# Altium footprint library Library.PcbLib: 298 footprints (part 13 of 19)
Each footprint in its own frame and in the unit in brackets; x right, y up, seen from the top. Pads: shape width x height; smd on the part's side, far side on the other; paste and mask are expansions set on the pad; w line width, h text height; cw(c..) or ccw(c..) is an arc to the next point about the centre after c.
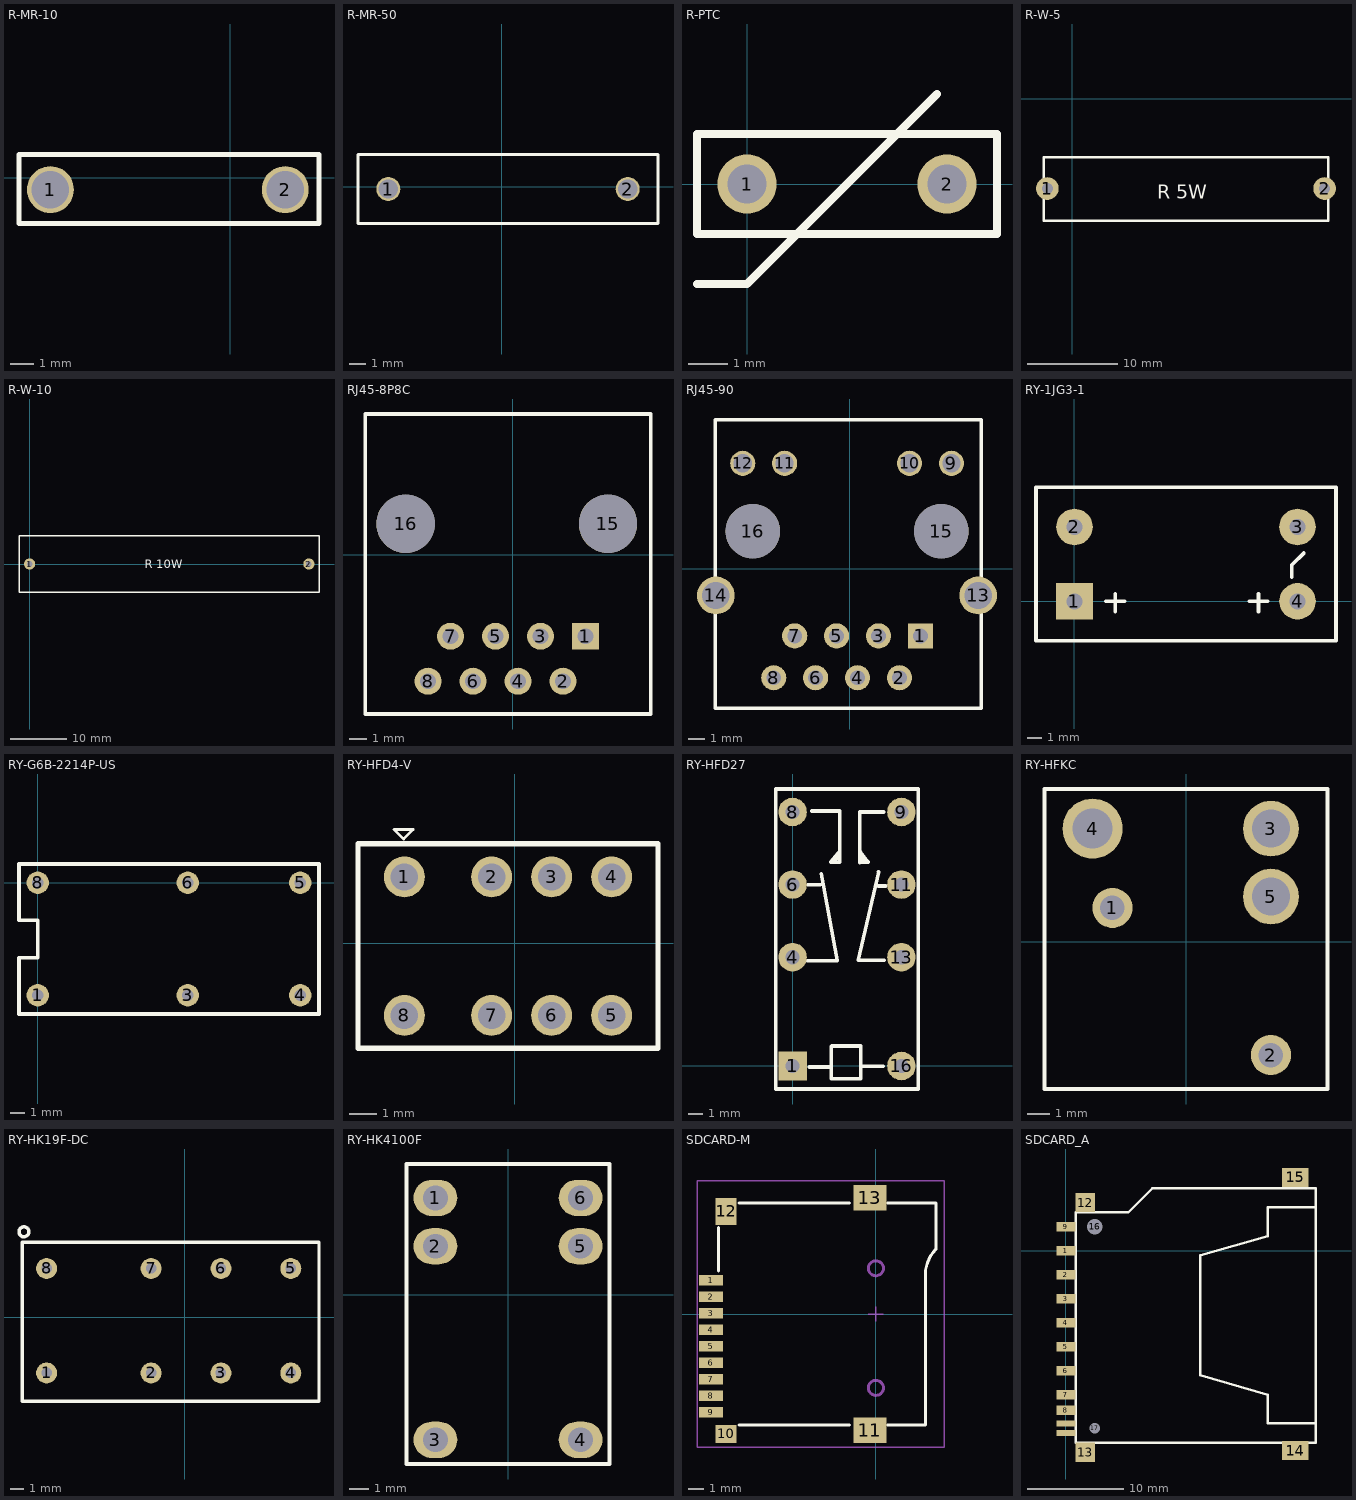
[diagram p12: the footprints below, top view; thin cyan lines are the x and y axes]

## R-MR-10 [mm] "康铜丝"
pads (2):
  round 2 hole 1.6: 1(-7.652,-0.508) 2(2.348,-0.508)
Top Overlay:
  lines w0.203: -8.992,-1.956 -8.992,0.991 3.785,0.991 3.785,-1.956 -8.992,-1.956

## R-MR-50 [mm] "康铜丝"
pads (2):
  round 1.5 hole 1.2: 1(-7.119,-0.127) 2(7.881,-0.127)
Top Overlay:
  lines w0.203: -9.017,-2.286 9.779,-2.286 9.779,2.032 -9.017,2.032 -9.017,-2.286

## R-PTC [mm]
pads (2):
  round 1.5 hole 1 unplated: 1(0,0) 2(5.08,0)
Top Overlay:
  lines w0.203: -1.27,-2.54 0,-2.54 4.826,2.286 ; -1.27,-1.27 -1.27,1.27 6.35,1.27 6.35,-1.27 -1.27,-1.27

## R-W-5 [mm] "功率电阻"
pads (2):
  round 2.5 hole 1.2: 1(-2.746,-9.911) 2(27.835,-9.911)
Top Overlay:
  lines w0.254: -3.153,-13.467 28.242,-13.467 28.242,-6.457 -3.153,-6.457 -3.153,-13.467
  text "R 5W" at 9.373,-11.049 h1.52
3D body "水泥电阻 5": height 4.35, standoff -6.85, extent -3.095,-13.431 28.185,-6.431

## R-W-10 [mm] "功率电阻"
pads (2):
  round 2 hole 1: 1(0,0) 2(50,0)
Top Overlay:
  lines w0.254: -1.905,-5.08 -1.905,5.08 50.8,5.08 51.816,5.08 51.816,-5.08 -1.905,-5.08
  text "R 10W" at 20.574,-0.762 h1.52

## RJ45-8P8C [mil]
pads (10):
  rect 60x60 hole 35.43: 1(162,-181)
  round 60 hole 35.43: 2(112,-281) 3(62,-181) 4(12,-281) 5(-38,-181) 6(-88,-281) 7(-138,-181) 8(-188,-281)
  round 129.92 hole 129.92: 15(212,69) 16(-238,69)
Top Overlay:
  lines w7.87: -327.96,-353.83 -327.96,313.09 307.41,313.09 307.41,-353.83 -327.96,-353.83
3D body "RJ45-8P-Pipe-Cat6.step": height 572.83, standoff -141.73, extent -359,-468.44 333.91,476.44

## RJ45-90 [mil]
pads (16):
  rect 60x60 hole 35.43: 1(169.2,-160)
  round 60 hole 35.43: 2(119.2,-260) 3(69.2,-160) 4(19.2,-260) 5(-30.8,-160) 6(-80.8,-260) 7(-130.8,-160) 8(-180.8,-260)
  round 60 hole 43.31: 9(243.21,251.81) 10(143.21,251.81) 11(-154.82,251.81) 12(-254.82,251.81)
  round 90 hole 64.96: 13(306.99,-63.54) 14(-318.99,-63.54)
  round 129.92 hole 129.92: 15(219.2,90) 16(-230.8,90)
Top Overlay:
  lines w7.87: -320.76,-332.83 -320.76,355.75 314.61,355.75 314.61,-332.83 -320.76,-332.83
3D body "User Library-RMS-001L-08A0-GY.STEP": height 90.55, standoff -570.87, extent -317.92,-329.29 312,509.29

## RY-1JG3-1 [mm]
pads (4):
  rect 2.5x2.5 hole 1.1: 1(0,0)
  round 2.5 hole 1.1: 2(0,5.08) 3(15.24,5.08) 4(15.24,0)
Top Overlay:
  lines w0.254: 2.159,0 3.429,0 ; 2.794,-0.709 2.794,0.508 ; 11.938,0 13.208,0 ; 12.573,-0.709 12.573,0.508 ; 14.85,1.65 14.85,2.475 15.675,3.3 ; -2.63,-2.7 -2.63,7.8 17.87,7.8 17.87,-2.7 -2.63,-2.7

## RY-G6B-2214P-US [mil]
pads (6):
  round 60 hole 30: 1(0,-300) 3(400,-300) 4(700,-300) 5(700,0) 6(400,0) 8(0,0)
Top Overlay:
  lines w10: -50,-350 -50,-200 0,-200 0,-100 -50,-100 -50,50 750,50 750,-350 -50,-350

## RY-HFD4-V [mm]
pads (8):
  round 1.5 hole 1: 1(-4.051,2.425) 2(-0.851,2.425) 3(1.349,2.425) 4(3.549,2.425) 5(3.549,-2.655) 6(1.349,-2.655) 7(-0.851,-2.655) 8(-4.051,-2.655)
Top Overlay:
  lines w0.1: -3.733,4.162 -4.43,4.162 -4.08,3.812 -4.075,3.812 -3.727,4.16
  lines w0.2: -5.751,-3.865 5.249,-3.865 5.249,3.635 -5.751,3.635 -5.751,-3.865

## RY-HFD27 [mm]
pads (8):
  rect 2x2 hole 1: 1(0,0)
  round 2 hole 1: 4(0,7.62) 6(0,12.7) 8(0,17.78) 9(7.62,17.78) 11(7.62,12.7) 13(7.62,7.62) 16(7.62,0)
Top Overlay:
  lines w0.254: 1.022,7.375 3.128,7.375 2.004,13.46 ; 1.058,12.693 1.932,12.693 ; 1.183,-0.066 2.629,-0.066 ; 1.344,17.85 3.307,17.85 3.306,14.263 2.664,14.263 3.217,14.923 3.021,14.406 ; 4.734,15.013 5.287,14.281 5.269,14.263 4.698,14.245 4.699,17.779 6.394,17.779 ; 4.805,14.781 4.966,14.352 ; 4.877,-0.013 6.34,-0.013 ; 6.001,12.604 6.519,12.604 ; 6.019,13.585 4.609,7.411 6.429,7.411 ; -1.19,-1.61 -1.19,19.39 8.81,19.39 8.81,-1.61 -1.19,-1.61 ; 2.7,-0.887 4.752,-0.887 4.77,-0.869 4.77,1.397 2.736,1.397 2.7,1.361 2.7,1.076 2.7,-0.887
3D body "User Library-OMRON G5V-2.STEP": height 10.92, standoff -4, extent -1.143,-1.27 8.857,19.13

## RY-HFKC [mm] "继电器"
height 11.8
pads (5):
  round 1.8 hole 1.1: 1(-3.302,1.524) 2(3.81,-5.08)
  round 2.5 hole 1.7: 3(3.81,5.08) 5(3.81,2.032)
  round 2.7 hole 1.8: 4(-4.191,5.08)
Top Overlay:
  lines w0.2: -6.35,-6.604 -6.35,6.858 6.35,6.858 6.35,-6.604 -6.35,-6.604

## RY-HK19F-DC [mil] "继电器"
pads (8):
  round 60 hole 30: 1(-395,-159.21) 2(-95.79,-159.21) 3(104.21,-159.21) 4(304.21,-159.21) 5(304.21,140) 6(104.21,140) 7(-95.79,140) 8(-395,140)
Top Overlay:
  circle w10: c-460,245 r14.14
  lines w10: -465,-240 -465,215 385,215 385,-240 -465,-240

## RY-HK4100F [mm] "继?"
height 11.8
pads (6):
  oval 2.3x1.9 hole 1.3: 1(-3.81,5.08) 2(-3.81,2.54) 3(-3.81,-7.62) 4(3.81,-7.62) 5(3.81,2.54) 6(3.81,5.08)
Top Overlay:
  lines w0.2: -5.334,-8.89 -5.334,6.858 5.334,6.858 5.334,-8.89 -5.334,-8.89
3D body: height 12, standoff 0, extent -5.334,-8.89 5.334,6.858

## SDCARD-M [mm] "TF卡"
height 1.5
pads (13):
  rect 1.6x0.7 smd: 1(-11.008,2.25) 2(-11.008,1.15) 3(-11.008,0.05) 4(-11.008,-1.05) 5(-11.008,-2.15) 6(-11.008,-3.25) 7(-11.008,-4.35) 8(-11.008,-5.45) 9(-11.008,-6.55)
  rect 1.4x1.2 smd: 10(-10,-8.004)
  rect 2.2x1.7 smd: 11(-0.4,-7.75) 13(-0.4,7.75)
  rect 1.4x1.8 smd: 12(-10,6.85)
Top Overlay:
  lines w0.2: -10.5,2.88 -10.5,5.756 ; -9.144,-7.4 -1.778,-7.4 ; -9.144,7.4 -1.778,7.4 ; 0.762,-7.4 3.3,-7.4 3.3,1.016 ; 0.762,7.4 4,7.4 4,4.318 ccw(c5.69,2.628) 3.3,2.628 3.3,0.762
Mechanical 1:
  circle w0.2: c0,-4.93 r0.5
  circle w0.2: c0,3.05 r0.5
Mechanical 15:
  lines w0.1: -0.5,0 0.5,0 ; 0,-0.5 0,0.5 ; -11.938,-8.89 4.572,-8.89 4.572,8.89 -11.938,8.89 -11.938,-8.89

## SDCARD_A [mm] "SD卡不自弹"
pads (17):
  rect 2x1 smd: 1(0,0) 2(0,-2.5) 3(0,-5) 4(0,-7.5) 5(0,-10) 6(0,-12.5) 7(0,-15) 8(0,-16.625) 9(0,2.5)
  rect 2x0.6 smd: 10(0,-19) 11(0,-18)
  rect 2x2 smd: 12(2,5) 13(2,-21)
  rect 2.8x2 smd: 14(23.876,-20.828) 15(23.876,7.62)
  round 1.5 hole 1.6: 16(3,2.5)
  round 1 hole 1.1: 17(3,-18.5)
Top Overlay:
  lines w0.254: 26,-18 21,-18 21,-15 14,-13 14,-0.5 21,1.5 21,4.5 26,4.5 ; 1,-20 1,4 6.5,4 9,6.5 26,6.5 26,-20 1,-20